# Altium footprint library PCB_ConnectorHDR.PcbLib: 221 footprints (part 14 of 14)
Each footprint in its own frame and in the unit in brackets; x right, y up, seen from the top. Pads: shape width x height; smd on the part's side, far side on the other; paste and mask are expansions set on the pad; w line width, h text height; cw(c..) or ccw(c..) is an arc to the next point about the centre after c.
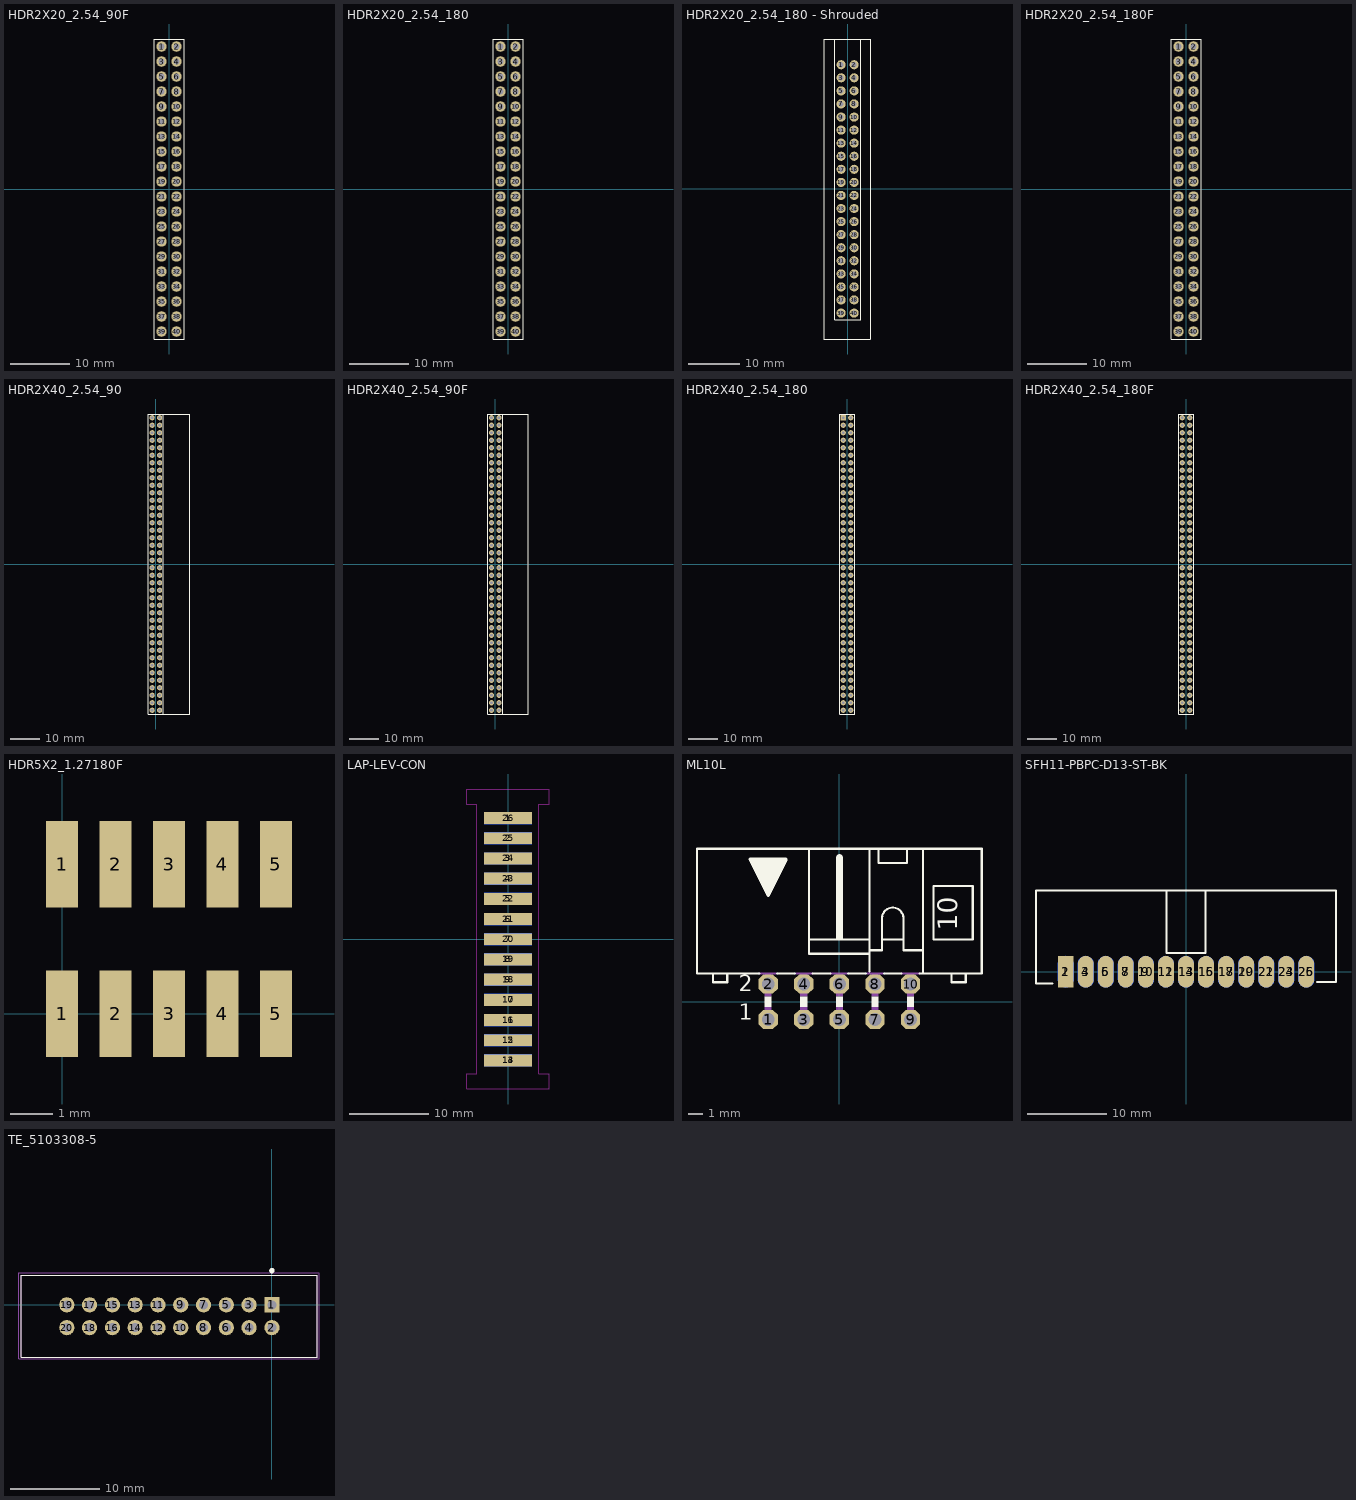
[diagram p13: the footprints below, top view; thin cyan lines are the x and y axes]

## HDR2X20_2.54_90F [mil]
height 169.29
pads (40):
  round 70 hole 39.37: 1(-50,950) 2(50,950) 3(-50,850) 4(50,850) 5(-50,750) 6(50,750) 7(-50,650) 8(50,650) 9(-50,550) 10(50,550) 11(-50,450) 12(50,450) 13(-50,350) 14(50,350) 15(-50,250) 16(50,250) 17(-50,150) 18(50,150) 19(-50,50) 20(50,50) 21(-50,-50) 22(50,-50) 23(-50,-150) 24(50,-150) 25(-50,-250) 26(50,-250) 27(-50,-350) 28(50,-350) 29(-50,-450) 30(50,-450) 31(-50,-550) 32(50,-550) 33(-50,-650) 34(50,-650) 35(-50,-750) 36(50,-750) 37(-50,-850) 38(50,-850) 39(-50,-950) 40(50,-950)
Top Overlay:
  lines w2: -100,-1000 100,-1000 ; -100,-1000 -100,1000 ; -100,-1000 -100,1000 ; -100,-1000 100,-1000 ; -100,1000 100,1000 ; -100,1000 100,1000 ; 100,-1000 100,1000 ; 100,-1000 100,1000
3D body "female_header_a-bl254-da-g40d.stp": height 197.35, standoff -125.48, extent -60,-1004.84 436.06,1005

## HDR2X20_2.54_180 [mil]
height 169.29
pads (40):
  round 70 hole 39.37: 1(-50,950) 2(50,950) 3(-50,850) 4(50,850) 5(-50,750) 6(50,750) 7(-50,650) 8(50,650) 9(-50,550) 10(50,550) 11(-50,450) 12(50,450) 13(-50,350) 14(50,350) 15(-50,250) 16(50,250) 17(-50,150) 18(50,150) 19(-50,50) 20(50,50) 21(-50,-50) 22(50,-50) 23(-50,-150) 24(50,-150) 25(-50,-250) 26(50,-250) 27(-50,-350) 28(50,-350) 29(-50,-450) 30(50,-450) 31(-50,-550) 32(50,-550) 33(-50,-650) 34(50,-650) 35(-50,-750) 36(50,-750) 37(-50,-850) 38(50,-850) 39(-50,-950) 40(50,-950)
Top Overlay:
  lines w2: -100,-1000 -100,1000 ; -100,-1000 100,-1000 ; -100,-1000 -100,1000 ; -100,-1000 100,-1000 ; -100,1000 100,1000 ; -100,1000 100,1000 ; 100,-1000 100,1000 ; 100,-1000 100,1000
3D body "pin_header_awl254-dg-g40d.stp": height 334.65, standoff -118.11, extent -99.99,-1000 100.01,1000

## HDR2X20_2.54_180 - Shrouded [mil]
height 169.29
pads (40):
  round 70 hole 39.37: 1(-50,950) 2(50,950) 3(-50,850) 4(50,850) 5(-50,750) 6(50,750) 7(-50,650) 8(50,650) 9(-50,550) 10(50,550) 11(-50,450) 12(50,450) 13(-50,350) 14(50,350) 15(-50,250) 16(50,250) 17(-50,150) 18(50,150) 19(-50,50) 20(50,50) 21(-50,-50) 22(50,-50) 23(-50,-150) 24(50,-150) 25(-50,-250) 26(50,-250) 27(-50,-350) 28(50,-350) 29(-50,-450) 30(50,-450) 31(-50,-550) 32(50,-550) 33(-50,-650) 34(50,-650) 35(-50,-750) 36(50,-750) 37(-50,-850) 38(50,-850) 39(-50,-950) 40(50,-950)
Top Overlay:
  lines w2: -183.86,-1148.43 174.41,-1148.43 174.41,1146.85 -183.86,1146.85 -183.86,-1148.43 ; -100,-1000 100,-1000 100,1146.85 -100,1146.85 -100,-1000
3D body "SBH11-_ _ _C-D20-ST-_ _.STEP": height 346.96, standoff -129.42, extent -181.89,-1148.43 176.38,1146.85
3D body "SBH11-_ _ _C-D20-ST-_ _.STEP": height 346.96, standoff -129.42, extent -181.89,-1148.43 176.38,1146.85

## HDR2X20_2.54_180F [mil]
height 169.29
pads (40):
  round 70 hole 39.37: 1(-50,950) 2(50,950) 3(-50,850) 4(50,850) 5(-50,750) 6(50,750) 7(-50,650) 8(50,650) 9(-50,550) 10(50,550) 11(-50,450) 12(50,450) 13(-50,350) 14(50,350) 15(-50,250) 16(50,250) 17(-50,150) 18(50,150) 19(-50,50) 20(50,50) 21(-50,-50) 22(50,-50) 23(-50,-150) 24(50,-150) 25(-50,-250) 26(50,-250) 27(-50,-350) 28(50,-350) 29(-50,-450) 30(50,-450) 31(-50,-550) 32(50,-550) 33(-50,-650) 34(50,-650) 35(-50,-750) 36(50,-750) 37(-50,-850) 38(50,-850) 39(-50,-950) 40(50,-950)
Top Overlay:
  lines w2: -100,-1000 100,-1000 ; -100,-1000 -100,1000 ; -100,-1000 -100,1000 ; -100,-1000 100,-1000 ; -100,1000 100,1000 ; -100,1000 100,1000 ; 100,-1000 100,1000 ; 100,-1000 100,1000
3D body "female_header_a-bl254-dg-g40d.stp": height 334.65, standoff -125.98, extent -98.42,-1004.92 98.43,1004.92

## HDR2X40_2.54_90 [mil]
height 169.29
pads (80):
  round 70 hole 39.37: 1(-50,1950) 2(50,1950) 3(-50,1850) 4(50,1850) 5(-50,1750) 6(50,1750) 7(-50,1650) 8(50,1650) 9(-50,1550) 10(50,1550) 11(-50,1450) 12(50,1450) 13(-50,1350) 14(50,1350) 15(-50,1250) 16(50,1250) 17(-50,1150) 18(50,1150) 19(-50,1050) 20(50,1050) 21(-50,950) 22(50,950) 23(-50,850) 24(50,850) 25(-50,750) 26(50,750) 27(-50,650) 28(50,650) 29(-50,550) 30(50,550) 31(-50,450) 32(50,450) 33(-50,350) 34(50,350) 35(-50,250) 36(50,250) 37(-50,150) 38(50,150) 39(-50,50) 40(50,50) 41(-50,-50) 42(50,-50) 43(-50,-150) 44(50,-150) 45(-50,-250) 46(50,-250) 47(-50,-350) 48(50,-350) 49(-50,-450) 50(50,-450) 51(-50,-550) 52(50,-550) 53(-50,-650) 54(50,-650) 55(-50,-750) 56(50,-750) 57(-50,-850) 58(50,-850) 59(-50,-950) 60(50,-950) 61(-50,-1050) 62(50,-1050) 63(-50,-1150) 64(50,-1150) 65(-50,-1250) 66(50,-1250) 67(-50,-1350) 68(50,-1350) 69(-50,-1450) 70(50,-1450) 71(-50,-1550) 72(50,-1550) 73(-50,-1650) 74(50,-1650) 75(-50,-1750) 76(50,-1750) 77(-50,-1850) 78(50,-1850) 79(-50,-1950) 80(50,-1950)
Top Overlay:
  lines w2: -100,-2000 -100,2000 ; -100,-2000 100,-2000 100,2000 -100,2000 ; -100,-2000 450,-2000 450,2000 -100,2000 ; -100,-2000 -100,2000
3D body "pin_header_awl254-da-g80d.stp": height 198.43, standoff -116.54, extent -62.44,-1995 444.64,2005

## HDR2X40_2.54_90F [mil]
height 169.29
pads (80):
  round 70 hole 39.37: 1(-50,1950) 2(50,1950) 3(-50,1850) 4(50,1850) 5(-50,1750) 6(50,1750) 7(-50,1650) 8(50,1650) 9(-50,1550) 10(50,1550) 11(-50,1450) 12(50,1450) 13(-50,1350) 14(50,1350) 15(-50,1250) 16(50,1250) 17(-50,1150) 18(50,1150) 19(-50,1050) 20(50,1050) 21(-50,950) 22(50,950) 23(-50,850) 24(50,850) 25(-50,750) 26(50,750) 27(-50,650) 28(50,650) 29(-50,550) 30(50,550) 31(-50,450) 32(50,450) 33(-50,350) 34(50,350) 35(-50,250) 36(50,250) 37(-50,150) 38(50,150) 39(-50,50) 40(50,50) 41(-50,-50) 42(50,-50) 43(-50,-150) 44(50,-150) 45(-50,-250) 46(50,-250) 47(-50,-350) 48(50,-350) 49(-50,-450) 50(50,-450) 51(-50,-550) 52(50,-550) 53(-50,-650) 54(50,-650) 55(-50,-750) 56(50,-750) 57(-50,-850) 58(50,-850) 59(-50,-950) 60(50,-950) 61(-50,-1050) 62(50,-1050) 63(-50,-1150) 64(50,-1150) 65(-50,-1250) 66(50,-1250) 67(-50,-1350) 68(50,-1350) 69(-50,-1450) 70(50,-1450) 71(-50,-1550) 72(50,-1550) 73(-50,-1650) 74(50,-1650) 75(-50,-1750) 76(50,-1750) 77(-50,-1850) 78(50,-1850) 79(-50,-1950) 80(50,-1950)
Top Overlay:
  lines w2: -100,-2000 -100,2000 ; -100,-2000 440,-2000 440,2000 -100,2000 ; -100,-2000 100,-2000 100,2000 -100,2000 ; -100,-2000 -100,2000
3D body "female_header_a-bl254-da-g80d.stp": height 198.43, standoff -124.41, extent -60,-1999.92 436.06,2009.92

## HDR2X40_2.54_180 [mil]
height 169.29
pads (80):
  rect 70x70 hole 39.37: 1(-50,1950)
  round 70 hole 39.37: 2(50,1950) 3(-50,1850) 4(50,1850) 5(-50,1750) 6(50,1750) 7(-50,1650) 8(50,1650) 9(-50,1550) 10(50,1550) 11(-50,1450) 12(50,1450) 13(-50,1350) 14(50,1350) 15(-50,1250) 16(50,1250) 17(-50,1150) 18(50,1150) 19(-50,1050) 20(50,1050) 21(-50,950) 22(50,950) 23(-50,850) 24(50,850) 25(-50,750) 26(50,750) 27(-50,650) 28(50,650) 29(-50,550) 30(50,550) 31(-50,450) 32(50,450) 33(-50,350) 34(50,350) 35(-50,250) 36(50,250) 37(-50,150) 38(50,150) 39(-50,50) 40(50,50) 41(-50,-50) 42(50,-50) 43(-50,-150) 44(50,-150) 45(-50,-250) 46(50,-250) 47(-50,-350) 48(50,-350) 49(-50,-450) 50(50,-450) 51(-50,-550) 52(50,-550) 53(-50,-650) 54(50,-650) 55(-50,-750) 56(50,-750) 57(-50,-850) 58(50,-850) 59(-50,-950) 60(50,-950) 61(-50,-1050) 62(50,-1050) 63(-50,-1150) 64(50,-1150) 65(-50,-1250) 66(50,-1250) 67(-50,-1350) 68(50,-1350) 69(-50,-1450) 70(50,-1450) 71(-50,-1550) 72(50,-1550) 73(-50,-1650) 74(50,-1650) 75(-50,-1750) 76(50,-1750) 77(-50,-1850) 78(50,-1850) 79(-50,-1950) 80(50,-1950)
Top Overlay:
  lines w2: -100,-2000 100,-2000 ; -100,-2000 -100,2000 ; -100,-2000 -100,2000 ; -100,-2000 100,-2000 ; -100,2000 100,2000 ; -100,2000 100,2000 ; 100,-2000 100,2000 ; 100,-2000 100,2000
3D body "User Library-PLD-80.step": height 330.71, standoff -118.11, extent -98.43,-1999 98.42,2001

## HDR2X40_2.54_180F [mil]
height 169.29
pads (80):
  round 70 hole 39.37: 1(-50,1950) 2(50,1950) 3(-50,1850) 4(50,1850) 5(-50,1750) 6(50,1750) 7(-50,1650) 8(50,1650) 9(-50,1550) 10(50,1550) 11(-50,1450) 12(50,1450) 13(-50,1350) 14(50,1350) 15(-50,1250) 16(50,1250) 17(-50,1150) 18(50,1150) 19(-50,1050) 20(50,1050) 21(-50,950) 22(50,950) 23(-50,850) 24(50,850) 25(-50,750) 26(50,750) 27(-50,650) 28(50,650) 29(-50,550) 30(50,550) 31(-50,450) 32(50,450) 33(-50,350) 34(50,350) 35(-50,250) 36(50,250) 37(-50,150) 38(50,150) 39(-50,50) 40(50,50) 41(-50,-50) 42(50,-50) 43(-50,-150) 44(50,-150) 45(-50,-250) 46(50,-250) 47(-50,-350) 48(50,-350) 49(-50,-450) 50(50,-450) 51(-50,-550) 52(50,-550) 53(-50,-650) 54(50,-650) 55(-50,-750) 56(50,-750) 57(-50,-850) 58(50,-850) 59(-50,-950) 60(50,-950) 61(-50,-1050) 62(50,-1050) 63(-50,-1150) 64(50,-1150) 65(-50,-1250) 66(50,-1250) 67(-50,-1350) 68(50,-1350) 69(-50,-1450) 70(50,-1450) 71(-50,-1550) 72(50,-1550) 73(-50,-1650) 74(50,-1650) 75(-50,-1750) 76(50,-1750) 77(-50,-1850) 78(50,-1850) 79(-50,-1950) 80(50,-1950)
Top Overlay:
  lines w2: -100,-2000 100,-2000 100,2000 -100,2000 -100,-2000
3D body "female_header_a-bl254-dg-g80d.stp": height 334.65, standoff -125.98, extent -98.42,-2004.92 98.43,2004.93

## HDR5X2_1.27180F [mm]
pads (10):
  rect 0.76x2.05 smd: 1(0,0) 1(0,3.55) 2(1.27,0) 2(1.27,3.55) 3(2.54,0) 3(2.54,3.55) 4(3.81,0) 4(3.81,3.55) 5(5.08,0) 5(5.08,3.55)

## LAP-LEV-CON [mm]
height 4.3
pads (26):
  rect 6x1.5 smd: 1(0,15.24) 2(0,12.7) 3(0,10.16) 4(0,7.62) 5(0,5.08) 6(0,2.54) 7(0,0) 8(0,-2.54) 9(0,-5.08) 10(0,-7.62) 11(0,-10.16) 12(0,-12.7) 13(0,-15.24)
  rect 6x1.5 smd far side: 14(0,-15.24) 15(0,-12.7) 16(0,-10.16) 17(0,-7.62) 18(0,-5.08) 19(0,-2.54) 20(0,0) 21(0,2.54) 22(0,5.08) 23(0,7.62) 24(0,10.16) 25(0,12.7) 26(0,15.24)
Keep-Out Layer:
  lines w0.05: -5.195,-18.83 5.194,-18.83 5.194,-16.916 3.897,-16.916 3.897,16.984 5.195,16.984 5.195,18.896 -5.192,18.896 -5.192,16.984 -3.925,16.984 -3.925,-16.917 -5.195,-16.917 -5.195,-18.83
3D body "female_header_a-bl254-dg-g26d.stp": height 1.44, standoff -3.56, extent 0.368,-16.633 12.068,16.637
3D body "female_header_a-bl254-dg-g26d.stp": height 1.44, standoff -3.56, extent -11.857,-16.642 -0.157,16.628

## ML10L [mil]
pads (10):
  oct 54x54 hole 36: 1(-200,-50) 2(-200,50) 3(-100,-50) 4(-100,50) 5(0,-50) 6(0,50) 7(100,-50) 8(100,50) 9(200,-50) 10(200,50)
Top Overlay:
  rectangle: -10,175 10,405
  rectangle: -245,380 -155,400
  rectangle: -235,360 -165,380
  rectangle: -225,340 -175,360
  rectangle: -215,320 -185,340
  rectangle: -205,310 -195,320
  rectangle: -210,-15 -190,15
  rectangle: -110,-15 -90,15
  rectangle: -10,-15 10,15
  rectangle: 90,-15 110,15
  rectangle: 190,-15 210,15
  lines w6: -225,80 -315,80 ; -175,80 -125,80 ; -75,80 -25,80 ; 25,80 75,80 ; 85,85 85,135 ; 110,430 110,390 190,390 190,430 ; 125,80 175,80 ; 225,80 235,80 ; 235,430 235,145 ; -355,80 -400,80 -400,430 -85,430 ; -355,80 -355,55 -315,55 -315,80 ; -355,80 -315,80 ; -85,175 -85,430 ; -85,175 85,175 ; -85,175 -85,135 85,135 ; -85,430 85,430 ; 85,135 85,145 ; 85,145 120,145 120,175 ; 85,145 85,175 ; 85,175 85,430 ; 85,430 400,430 400,80 355,80 ; 120,175 120,235 cw(c150,235) 180,235 180,175 ; 120,175 180,175 ; 180,175 180,145 235,145 ; 235,80 235,145 ; 235,80 315,80 ; 315,80 315,55 355,55 355,80 ; 315,80 355,80 ; 265,175 375,175 375,325 265,325 265,175
  lines w10: -250,400 -150,400 -200,300 -250,400
  lines w20: 0,395 0,405
  text "1" at -282,-66 h77.5
  text "2" at -283,14 h77.5
  text "10" at 350,200 h93
Mechanical 16:
  rectangle: -210,15 -190,80
  rectangle: -210,-60 -190,-15
  rectangle: -110,15 -90,80
  rectangle: -110,-60 -90,-15
  rectangle: -10,15 10,80
  rectangle: -10,-60 10,-15
  rectangle: 90,15 110,80
  rectangle: 90,-60 110,-15
  rectangle: 190,15 210,80
  rectangle: 190,-60 210,-15
  lines w6: -225,80 -175,80 ; -125,80 -75,80 ; -25,80 25,80 ; 75,80 85,80 ; 85,85 85,80 ; 125,80 85,80 ; 175,80 225,80
3D body "09185106323_angled_10-pin_2_9_PCB.stp": height 362.7, standoff -125.48, extent -400,-63 400,429.91

## SFH11-PBPC-D13-ST-BK [mm]
pads (26):
  rect 2x4 smd: 1(-15.24,0)
  oval 2x4 smd far side: 2(-15.24,0) 4(-12.7,0) 6(-10.16,0) 8(-7.62,0) 10(-5.08,0) 12(-2.54,0) 14(0,0) 16(2.54,0) 18(5.08,0) 20(7.62,0) 22(10.16,0) 24(12.7,0) 26(15.24,0)
  oval 2x4 smd: 3(-12.7,0) 5(-10.16,0) 7(-7.62,0) 9(-5.08,0) 11(-2.54,0) 13(0,0) 15(2.54,0) 17(5.08,0) 19(7.62,0) 21(10.16,0) 23(12.7,0) 25(15.24,0)
Top Overlay:
  lines w0.254: -16.9,-1.5 -19,-1.5 -19,10.3 19,10.3 19,-1.3 16.6,-1.3 ; -2.5,10.3 -2.5,2.4 2.5,2.4 2.5,10.3
3D body "con_header.stp": height 2.94, standoff -4.06, extent -19,-1.35 19.1,10.35

## TE_5103308-5 [mm]
pads (20):
  rect 1.7x1.7 hole 1: 1(0,0)
  round 1.7 hole 1: 2(0,-2.54) 3(-2.54,0) 4(-2.54,-2.54) 5(-5.08,0) 6(-5.08,-2.54) 7(-7.62,0) 8(-7.62,-2.54) 9(-10.16,0) 10(-10.16,-2.54) 11(-12.7,0) 12(-12.7,-2.54) 13(-15.24,0) 14(-15.24,-2.54) 15(-17.78,0) 16(-17.78,-2.54) 17(-20.32,0) 18(-20.32,-2.54) 19(-22.86,0) 20(-22.86,-2.54)
Top Overlay:
  circle w0.3: c0,3.81 r0.15
  lines w0.127: -27.94,-5.842 5.08,-5.842 5.08,3.302 -27.94,3.302 -27.94,-5.842
Mechanical 13:
  circle w0.3: c0,0 r0.15
  lines w0.127: -27.94,-5.842 5.08,-5.842 5.08,3.302 -27.94,3.302 -27.94,-5.842
B-Component:
  lines w0.05: -28.19,-6 5.25,-6 5.25,3.552 -28.19,3.552 -28.19,-6
3D body "5103308-5.stp": height 10, standoff -2.9, extent -27.945,-5.844 5.075,3.3